# Altium footprint library IND_SMD.PcbLib: 118 footprints (part 6 of 8)
Each footprint in its own frame and in the unit in brackets; x right, y up, seen from the top. Pads: shape width x height; smd on the part's side, far side on the other; paste and mask are expansions set on the pad; w line width, h text height; cw(c..) or ccw(c..) is an arc to the next point about the centre after c.
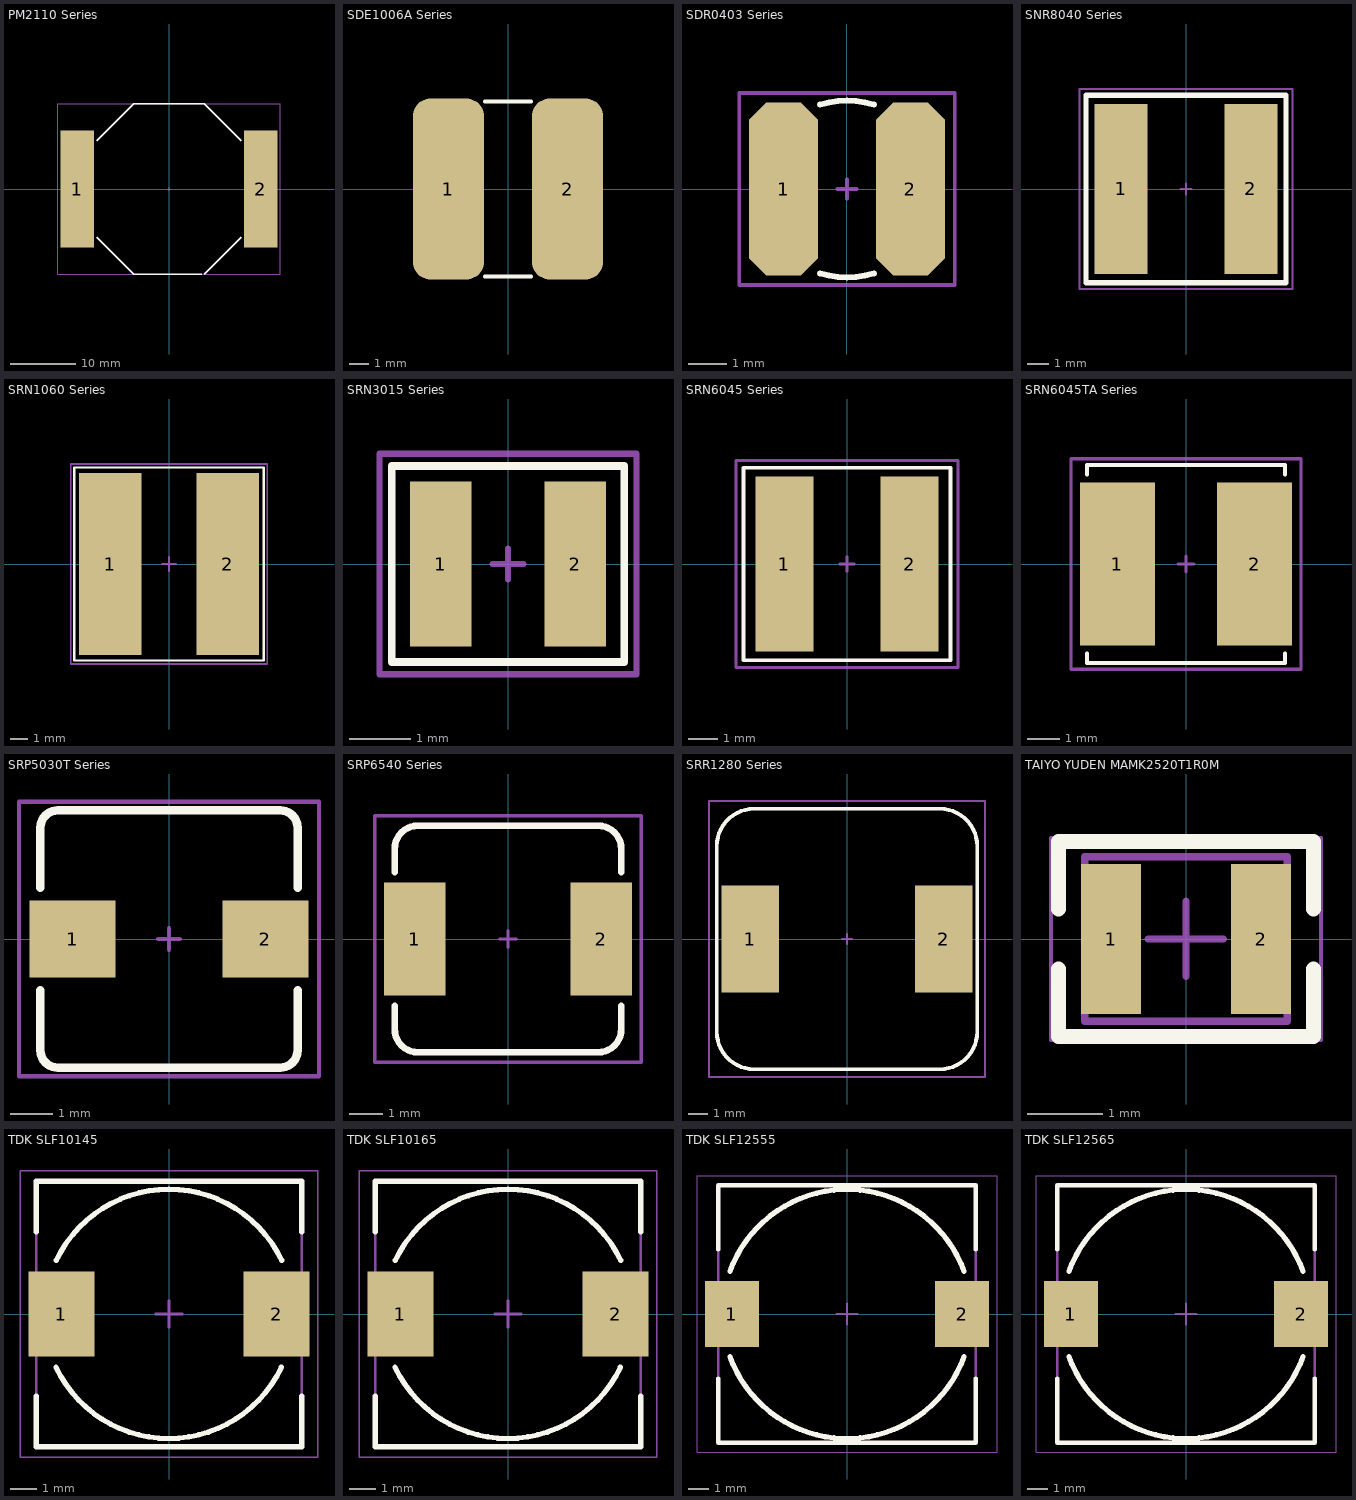
[diagram p5: the footprints below, top view; thin cyan lines are the x and y axes]

## PM2110 Series [mm] "PM2110 Series Inductor Package"
height 11
pads (2):
  rect 5.1x17.8 smd: 1(-14,0) 2(14,0)
Top Overlay:
  lines w0.2: -11.05,-7.35 -5.4,-13 5,-13 ; -11.05,7.35 -5.4,13 -5,13 5.4,13 11.05,7.35 ; 5.4,-13 11.05,-7.35
Mechanical 15:
  lines w0.1: -0.25,0 0.25,0 ; 0,-0.25 0,0.25 ; -17,-13 17,-13 17,13 -17,13 -17,-13
3D body "User Library-Inductor Bourns PM2110 model ST214.STEP": height 16.25, standoff 0, extent -15.3,-12.7 15.3,12.7

## SDE1006A Series [mm] "SMD Power Inductors"
height 5.4
pads (2):
  rrect50% 3.75x9.5 smd: 1(-3.125,0) 2(3.125,0)
Top Overlay:
  lines w0.2: -1.2,-4.6 1.2,-4.6 ; -1.2,4.6 1.2,4.6
3D body "SDE1006A.STEP": height 5.4, standoff 0, extent -4.942,-4.5 4.942,4.5

## SDR0403 Series [mm]
height 3.2
pads (2):
  oct 1.8x4.5 smd: 1(-1.65,0) 2(1.65,0)
Top Overlay:
  lines w0.157: -0.697,-2.192 ccw(c0,0) 0.697,-2.192 ; -0.697,2.192 cw(c0,0) 0.697,2.192
Mechanical 15:
  lines w0.1: -0.25,0 0.25,0 ; 0,-0.25 0,0.25 ; -2.8,-2.5 -2.8,2.5 2.8,2.5 2.8,-2.5 -2.8,-2.5
3D body "Inductor SDR0403 Series.STEP": height 3.25, standoff 0, extent -2.201,-2.25 2.201,2.25

## SNR8040 Series [mm] "SRN8040 Series Inductor Package"
height 4
pads (2):
  rect 2.5x8 smd: 1(-3.05,0) 2(3.05,0)
Top Overlay:
  lines w0.254: -4.7,-4.4 4.7,-4.4 4.7,4.4 -4.7,4.4 -4.7,-4.4
Mechanical 15:
  lines w0.1: -0.25,0 0.25,0 ; 0,-0.25 0,0.25 ; -5,-4.7 5,-4.7 5,4.7 -5,4.7 -5,-4.7
3D body "Inductor SRN8040 Series.STEP": height 4, standoff 0, extent -4.009,-4 4.009,4

## SRN1060 Series [mm]
height 1.5
pads (2):
  rect 3.5x10.2 smd: 1(-3.3,0) 2(3.3,0)
Top Overlay:
  lines w0.127: -5.3,-5.4 -5.3,5.4 5.3,5.4 5.3,-5.4 -5.3,-5.4
Mechanical 15:
  lines w0.1: -0.4,0 0.4,0 ; 0,-0.4 0,0.4 ; -5.5,-5.6 -5.5,5.6 5.5,5.6 5.5,-5.6 -5.5,-5.6
3D body "User Library-SRN1060.STEP": height 6.1, standoff 0, extent -4.9,-5 4.9,5

## SRN3015 Series [mm]
height 1.5
pads (2):
  rect 1x2.7 smd: 1(-1.1,0) 2(1.1,0)
Top Overlay:
  lines w0.127: -1.9,-1.6 1.9,-1.6 1.9,1.6 -1.9,1.6 -1.9,-1.6
Mechanical 15:
  lines w0.1: -0.25,0 0.25,0 ; 0,-0.25 0,0.25 ; -2.1,-1.8 2.1,-1.8 2.1,1.8 -2.1,1.8 -2.1,-1.8
3D body "Inductor SRN3015 Series.STEP": height 1.5, standoff 0, extent -1.51,-1.362 1.51,1.362

## SRN6045 Series [mm]
height 1.5
pads (2):
  rect 2x6 smd: 1(-2.15,0) 2(2.15,0)
Top Overlay:
  lines w0.127: -3.556,-3.302 -3.556,3.302 3.556,3.302 3.556,-3.302 -3.556,-3.302
Mechanical 15:
  lines w0.1: -0.25,0 0.25,0 ; 0,-0.25 0,0.25 ; -3.81,-3.556 -3.81,3.556 3.81,3.556 3.81,-3.556 -3.81,-3.556
3D body "SRN6045 Series.STEP": height 4.5, standoff 0, extent -3.15,-3 3.15,3

## SRN6045TA Series [mm]
height 4.2
pads (2):
  rect 2.35x5.1 smd: 1(-2.15,0) 2(2.15,0)
Top Overlay:
  lines w0.127: -3.1,-2.8 -3.1,-3.1 3.1,-3.1 3.1,-2.8 ; -3.1,2.8 -3.1,3.1 3.1,3.1 3.1,2.8
Mechanical 15:
  lines w0.1: -0.25,0 0.25,0 ; 0,-0.25 0,0.25 ; -3.6,-3.3 3.6,-3.3 3.6,3.3 -3.6,3.3 -3.6,-3.3
3D body "SRN6045TA Series.STEP": height 4.2, standoff 0, extent -3,-3 3,3

## SRP5030T Series [mm]
height 2.8
pads (2):
  rect 2x1.8 smd: 1(-2.25,0) 2(2.25,0)
Top Overlay:
  lines w0.2: -3,-1.2 -3,-2.6 ccw(c-2.6,-2.6) -2.6,-3 2.6,-3 ccw(c2.6,-2.6) 3,-2.6 3,-1.2 ; -3,1.2 -3,2.6 cw(c-2.6,2.6) -2.6,3 2.6,3 cw(c2.6,2.6) 3,2.6 3,1.2
Mechanical 15:
  lines w0.1: -0.25,0 0.25,0 ; 0,-0.25 0,0.25 ; -3.5,-3.2 3.5,-3.2 3.5,3.2 -3.5,3.2 -3.5,-3.2
3D body "User Library-SRP-5030 Inductor.step": height 2.8, standoff 0, extent -3,-2.85 3,2.85

## SRP6540 Series [mm]
height 4
pads (2):
  rect 1.85x3.4 smd: 1(-2.8,0) 2(2.8,0)
Top Overlay:
  lines w0.2: -3.4,-2 -3.4,-2.7 ccw(c-2.7,-2.7) -2.7,-3.4 2.7,-3.4 ccw(c2.7,-2.7) 3.4,-2.7 3.4,-2 ; -3.4,2 -3.4,2.7 cw(c-2.7,2.7) -2.7,3.4 2.7,3.4 cw(c2.7,2.7) 3.4,2.7 3.4,2
Mechanical 15:
  lines w0.1: -0.25,0 0.25,0 ; 0,-0.25 0,0.25 ; -4,-3.7 -4,3.7 4,3.7 4,-3.7 -4,-3.7
3D body "User Library-SRP6540 coil.step": height 4.19, standoff 0.07, extent -3.366,-3.25 3.366,3.252

## SRR1280 Series [mm]
height 7.5
pads (2):
  rect 2.9x5.4 smd: 1(-4.9,0) 2(4.9,0)
Top Overlay:
  lines w0.2: -6.6,-4.7 ccw(c-4.7,-4.7) -4.7,-6.6 4.7,-6.6 ccw(c4.7,-4.7) 6.6,-4.7 6.6,4.7 ccw(c4.7,4.7) 4.7,6.6 -4.7,6.6 ccw(c-4.7,4.7) -6.6,4.7 -6.6,-4.7
Mechanical 15:
  lines w0.1: -0.25,0 0.25,0 ; 0,-0.25 0,0.25 ; -7,-7 -7,7 7,7 7,-7 -7,-7
3D body "Inductor SRR1280 Series.STEP": height 7.51, standoff 0, extent -6.25,-6.25 6.25,6.25

## TAIYO YUDEN MAMK2520T1R0M [mm] "Inductor, 2-Leads, Body 2.50x2.00mm, IPC Medium Density"
height 1.2
pads (2):
  rect 0.8x2 smd: 1(-1,0) 2(1,0)
Top Overlay:
  lines w0.2: -1.7,-0.4 -1.7,-1.3 1.7,-1.3 1.7,-0.4 ; -1.7,0.4 -1.7,1.3 1.7,1.3 1.7,0.4
Mechanical 13:
  lines w0.1: -1.35,-1.1 -1.35,1.1 1.35,1.1 1.35,-1.1 -1.35,-1.1
Mechanical 15:
  lines w0.05: -1.8,-1.35 -1.8,1.35 1.8,1.35 1.8,-1.35 -1.8,-1.35
  lines w0.1: -0.5,0 0.5,0 ; 0,-0.5 0,0.5
3D body "MAMK2520T1R0M.STEP": height 1.2, standoff 0, extent -1.3,-1.025 1.3,1.025

## TDK SLF10145 [mm] "Precision Wire Wound Inductor, 2-Leads, Body 10.10x10.10mm, IPC Medium Density"
height 4.53
pads (2):
  rect 2.5x3.2 smd: 1(-4.05,0) 2(4.05,0)
Top Overlay:
  lines w0.2: -5,-3.1 -5,-5 5,-5 5,-3.1 ; -5,3.1 -5,5 5,5 5,3.1 ; -4.253,-2.01 ccw(c-0.01,0.01) 4.234,-2.01 ; -4.243,2.021 cw(c0,0) 4.243,2.021
Mechanical 13:
  lines w0.1: -5,-5 -5,5 5,5 5,-5 -5,-5
Mechanical 15:
  lines w0.05: -5.6,-5.4 -5.6,5.4 5.6,5.4 5.6,-5.4 -5.6,-5.4
  lines w0.1: -0.5,0 0.5,0 ; 0,-0.5 0,0.5
3D body "TDK - SLF10145.step": height 4.53, standoff 0, extent -5.05,-5.05 5.05,5.05

## TDK SLF10165 [mm] "Precision Wire Wound Inductor, 2-Leads, Body 10.10x10.10mm, IPC Medium Density"
height 6.53
pads (2):
  rect 2.5x3.2 smd: 1(-4.05,0) 2(4.05,0)
Top Overlay:
  lines w0.2: -5,-3.1 -5,-5 5,-5 5,-3.1 ; -5,3.1 -5,5 5,5 5,3.1 ; -4.253,-2.01 ccw(c-0.01,0.01) 4.234,-2.01 ; -4.243,2.021 cw(c0,0) 4.243,2.021
Mechanical 13:
  lines w0.1: -5,-5 5,-5 5,5 -5,5 -5,-5
Mechanical 15:
  lines w0.05: -5.6,-5.4 5.6,-5.4 5.6,5.4 -5.6,5.4 -5.6,-5.4
  lines w0.1: -0.5,0 0.5,0 ; 0,-0.5 0,0.5
3D body "TDK - SLF10165.step": height 6.53, standoff 0, extent -5.05,-5.05 5.05,5.05

## TDK SLF12555 [mm] "Precision Wire Wound Inductor, 2-Leads, Body 12.50x12.50mm, IPC Medium Density"
height 5.5
pads (2):
  rect 2.6x3.2 smd: 1(-5.55,0) 2(5.55,0)
Top Overlay:
  lines w0.2: -6.2,-3.1 -6.2,-6.2 6.2,-6.2 6.2,-3.1 ; -6.2,3.1 -6.2,6.2 6.2,6.2 6.2,3.1
  lines w0.254: -5.639,-2.05 ccw(c0,0) 5.639,-2.05 ; -5.639,2.05 cw(c0,0) 5.639,2.05
Mechanical 13:
  lines w0.1: -6.2,-6.2 -6.2,6.2 6.2,6.2 6.2,-6.2 -6.2,-6.2
Mechanical 15:
  lines w0.05: -7.225,-6.65 -7.225,6.65 7.225,6.65 7.225,-6.65 -7.225,-6.65
  lines w0.1: -0.5,0 0.5,0 ; 0,-0.5 0,0.5
3D body "TDK - SLF12555.step": height 5.53, standoff 0, extent -6.335,-6.325 6.335,6.325

## TDK SLF12565 [mm] "Precision Wire Wound Inductor, 2-Leads, Body 12.50x12.50mm, IPC Medium Density"
height 6.5
pads (2):
  rect 2.6x3.2 smd: 1(-5.55,0) 2(5.55,0)
Top Overlay:
  lines w0.2: -6.2,-3.1 -6.2,-6.2 6.2,-6.2 6.2,-3.1 ; -6.2,3.1 -6.2,6.2 6.2,6.2 6.2,3.1
  lines w0.254: -5.639,-2.05 ccw(c0,0) 5.639,-2.05 ; -5.639,2.05 cw(c0,0) 5.639,2.05
Mechanical 13:
  lines w0.1: -6.2,-6.2 -6.2,6.2 6.2,6.2 6.2,-6.2 -6.2,-6.2
Mechanical 15:
  lines w0.05: -7.225,-6.65 -7.225,6.65 7.225,6.65 7.225,-6.65 -7.225,-6.65
  lines w0.1: -0.5,0 0.5,0 ; 0,-0.5 0,0.5
3D body "TDK - SLF12565.step": height 6.85, standoff 0, extent -6.335,-6.325 6.335,6.325